# Altium footprint library MyPcbLib.PcbLib: 233 footprints (part 14 of 15)
Each footprint in its own frame and in the unit in brackets; x right, y up, seen from the top. Pads: shape width x height; smd on the part's side, far side on the other; paste and mask are expansions set on the pad; w line width, h text height; cw(c..) or ccw(c..) is an arc to the next point about the centre after c.
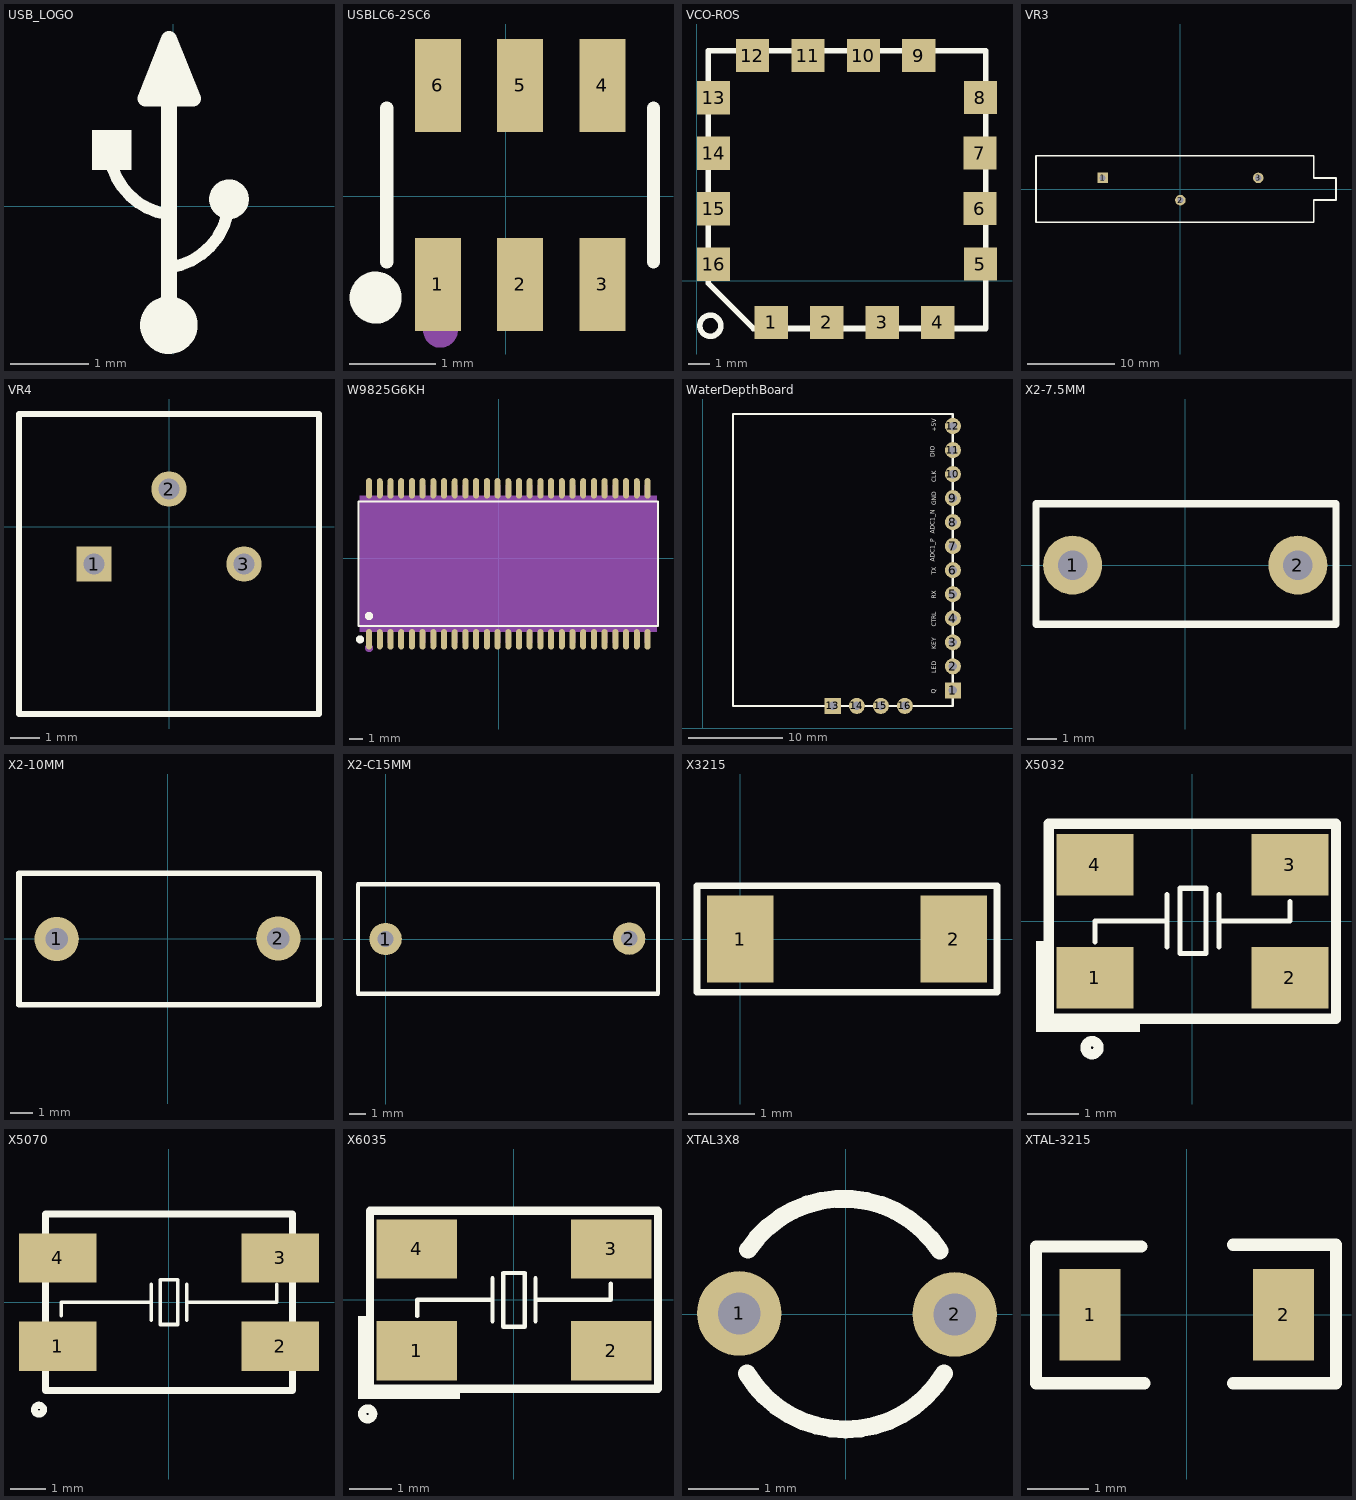
[diagram p13: the footprints below, top view; thin cyan lines are the x and y axes]

## USB_LOGO [mm]
height 10.16
Top Overlay:
  circle w0.381: c-0.053,-1.518 r0.178
  circle w0.254: c0.716,0.09 r0.127
  rectangle: -1.039,0.463 -0.529,0.973
  lines w0.152: -0.779,0.504 ccw(c0.068,0.774) -0.051,-0.107 ; -0.051,-0.784 ccw(c-0.171,0.097) 0.717,0.046
  lines w0.203: -0.051,-1.384 -0.051,2.139 ; -0.051,1.375 -0.051,2.139 ; -0.051,2.139 -0.351,1.377 0.259,1.377 -0.051,2.139
  lines w0.381: -0.051,1.479 -0.051,1.58

## USBLC6-2SC6 [mm]
pads (6):
  rect 0.532x1.072 smd: 1(-0.783,-1.02) 2(0.167,-1.02) 3(1.117,-1.02) 4(1.117,1.278) 5(0.167,1.278) 6(-0.783,1.278)
Top Overlay:
  circle w0.3: c-1.501,-1.172 r0.15
  lines w0.152: -1.372,-0.76 -1.372,1.018 ; 1.707,-0.76 1.707,1.018
Mechanical 15:
  circle w0.2: c-0.753,-1.551 r0.1

## VCO-ROS [mm] "ROS-425-319"
height 5.33
pads (16):
  rect 1.52x1.52 smd: 1(3.404,-1.905) 2(5.944,-1.905) 3(8.484,-1.905) 4(11.024,-1.905) 5(12.979,0.768) 6(12.954,3.308) 7(12.954,5.848) 8(12.979,8.388) 9(10.16,10.312) 10(7.62,10.312) 11(5.08,10.312) 12(2.54,10.312) 13(0.762,8.382) 14(0.762,5.842) 15(0.762,3.302) 16(0.762,0.762)
Top Overlay:
  circle w0.254: c0.61,-2.057 r0.483
  lines w0.254: 0.508,-0.108 2.584,-2.184 13.233,-2.184 13.233,10.541 0.508,10.541 0.508,-0.108
3D body "ROS-425-319 in CK605 case detailed.step": height 4.57, standoff 0, extent 0.508,-2.184 13.208,10.516

## VR3 [mm] "Tapped Resistor; 3 Leads"
pads (3):
  rect 1.2x1.2 hole 0.7: 1(-8.89,1.27)
  round 1.2 hole 0.7: 2(0,-1.27) 3(8.89,1.27)
Top Overlay:
  lines w0.2: -16.51,-3.81 -16.51,3.81 15.24,3.81 15.24,1.27 17.78,1.27 17.78,-1.27 15.24,-1.27 15.24,-3.81 -16.51,-3.81
3D body "vr3.STEP": height 10, standoff 0, extent -16.576,-3.556 16.424,3.544

## VR4 [mm] "Feed-Through Capacitor; 3 Leads"
pads (3):
  rect 1.2x1.2 hole 0.7: 1(-2.54,-1.27)
  round 1.2 hole 0.7: 2(0,1.27) 3(2.54,-1.27)
Top Overlay:
  lines w0.2: -5.08,-6.35 -5.08,3.81 2.54,3.81 5.08,3.81 5.08,-6.35 -5.08,-6.35
3D body "vr4.STEP": height 6, standoff 0, extent -5.022,-6.321 4.978,3.679

## W9825G6KH [mil]
pads (54):
  oval 17.64x60 smd: 1(-381.05,-238.98) 2(-349.55,-238.98) 3(-318.06,-238.98) 4(-286.56,-238.98) 5(-255.06,-238.98) 6(-223.57,-238.98) 7(-192.07,-238.98) 8(-160.57,-238.98) 9(-129.08,-238.98) 10(-97.58,-238.98) 11(-66.09,-238.98) 12(-34.59,-238.98) 13(-3.09,-238.98) 14(28.4,-238.98) 15(59.9,-238.98) 16(91.39,-238.98) 17(122.89,-238.98) 18(154.39,-238.98) 19(185.88,-238.98) 20(217.38,-238.98) 21(248.87,-238.98) 22(280.37,-238.98) 23(311.87,-238.98) 24(343.36,-238.98) 25(374.86,-238.98) 26(406.36,-238.98) 27(437.85,-238.98) 28(437.85,205.28) 29(406.36,205.28) 30(374.86,205.28) 31(343.36,205.28) 32(311.87,205.28) 33(280.37,205.28) 34(248.87,205.28) 35(217.38,205.28) 36(185.88,205.28) 37(154.39,205.28) 38(122.89,205.28) 39(91.39,205.28) 40(59.9,205.28) 41(28.4,205.28) 42(-3.09,205.28) 43(-34.59,205.28) 44(-66.09,205.28) 45(-97.58,205.28) 46(-129.08,205.28) 47(-160.57,205.28) 48(-192.07,205.28) 49(-223.57,205.28) 50(-255.06,205.28) 51(-286.56,205.28) 52(-318.06,205.28) 53(-349.55,205.28) 54(-381.05,205.28)
Top Overlay:
  circle w11.81: c-381.05,-170.35 r5.91
  circle w11.81: c-407.68,-238.98 r5.91
  lines w6: -412,-199.98 -412,166.28 468.8,166.28 468.8,-199.98 -412,-199.98
Mechanical 4:
  region: -409,-216.85 -409,183.15 465.8,183.15 465.8,-216.85
Mechanical 5:
  drawing of 108 lines, arcs and shapes, not listed
Mechanical 6:
  circle w2.36: c-409,-248.35 r1.18
Mechanical 15:
  circle w11.81: c-381.05,-264.09 r5.91

## WaterDepthBoard [mm]
pads (16):
  rect 1.7x1.7 hole 0.9: 1(26.468,3.99) 13(13.768,2.339)
  round 1.7 hole 0.9: 2(26.468,6.53) 3(26.468,9.07) 4(26.468,11.61) 5(26.468,14.15) 6(26.468,16.69) 7(26.468,19.23) 8(26.468,21.77) 9(26.468,24.31) 10(26.468,26.85) 11(26.468,29.39) 12(26.468,31.93) 14(16.308,2.339) 15(18.848,2.339) 16(21.388,2.339)
Top Overlay:
  lines w0.254: 3.227,2.339 3.227,13.642 3.227,33.2 26.468,33.2 26.468,13.642 26.468,2.339 3.227,2.339
  text "Q" at 24.816,3.625 h0.76
  text "LED" at 24.854,5.784 h0.76
  text "KEY" at 24.854,8.324 h0.76
  text "CTRL" at 24.846,10.737 h0.76
  text "RX" at 24.854,13.658 h0.76
  text "TX" at 24.854,16.198 h0.76
  text "ADC1_P" at 24.719,17.595 h0.76
  text "ADC1_N" at 24.719,20.516 h0.76
  text "GND" at 24.846,23.564 h0.76
  text "CLK" at 24.846,25.977 h0.76
  text "DIO" at 24.719,28.644 h0.76
  text "+5V" at 24.846,31.311 h0.76

## X2-7.5MM [mm]
pads (2):
  round 2 hole 1: 1(-3.823,0) 2(3.823,0)
Top Overlay:
  lines w0.254: -5.067,-2.007 5.118,-2.007 5.118,2.083 -5.067,2.083 -5.067,-2.007
3D body "10MM_X2_cap.step": height 9.5, standoff -3, extent -4.966,-1.956 5.034,2.044

## X2-10MM [mm] "18.25MM*11.4MM*5.78MM0.1UF 脚距15MM"
pads (2):
  round 2 hole 1: 1(-5,-0.013) 2(5,0.013)
Top Overlay:
  lines w0.254: -6.702,-2.984 6.836,-2.984 6.836,2.959 -6.702,2.959 -6.702,-2.984
3D body "X2-10MM.step": height 12, standoff -2.81, extent -6.5,-2.489 6.5,2.512

## X2-C15MM [mm] "18.25MM*11.4MM*5.78MM0.1UF 脚距15MM"
pads (2):
  round 2 hole 1: 1(0,0) 2(15.011,0.025)
Top Overlay:
  lines w0.254: -1.702,-3.378 16.789,-3.378 16.789,3.378 -1.702,3.378 -1.702,-3.378
3D body "X2-15MM.step": height 14, standoff -2.81, extent -1.431,-3.496 16.569,3.505

## X3215 [mm]
pads (2):
  rect 1x1.3 smd: 1(0,0) 2(3.2,0)
Top Overlay:
  lines w0.1: -0.65,-0.8 -0.65,0.8 3.85,0.8 3.85,-0.8 -0.65,-0.8
3D body "User Library-X3215.STEP": height 0.81, standoff 0, extent 0,-0.762 3.2,0.738

## X5032 [mm]
pads (4):
  rect 1.5x1.2 smd: 1(-1.9,-1.1) 2(1.9,-1.1) 3(1.9,1.1) 4(-1.9,1.1)
Top Overlay:
  circle w0.2: c-1.956,-2.464 r0.127
  rectangle: -3.023,-2.159 -1.016,-1.905
  rectangle: -3.048,-2.159 -2.87,-0.381
  lines w0.1: -1.897,-0.406 -1.897,0.008 -0.496,0.008 ; -0.496,-0.5 -0.496,0.516 ; 0.52,-0.5 0.52,0.516 ; 0.52,0.008 1.902,0.008 1.905,0.016 1.905,0.381 ; -0.242,-0.627 -0.242,0.643 0.266,0.643 0.266,0.326 0.266,-0.309 0.266,-0.627 -0.242,-0.627
  lines w0.2: -2.8,-1.9 2.8,-1.9 2.8,1.9 -2.8,1.9 -2.8,-1.9
3D body "User Library-CRYSTALSMD5X32.STEP": height 1, standoff 0, extent -2.5,-1.6 2.5,1.6

## X5070 [mm]
pads (4):
  rect 2.2x1.4 smd: 1(-3.15,-1.25) 2(3.15,-1.25) 3(3.15,1.25) 4(-3.15,1.25)
Top Overlay:
  circle w0.2: c-3.683,-3.048 r0.127
  lines w0.1: -3.048,-0.381 -3.048,0 -0.508,0 ; -0.508,-0.508 -0.508,0.508 ; 0.508,-0.508 0.508,0.508 ; 0.508,0 3.048,0 3.048,0.508 ; -0.254,-0.635 -0.254,0.635 0.254,0.635 0.254,-0.635 -0.254,-0.635
  lines w0.2: -3.5,-2.5 3.5,-2.5 3.5,2.5 -3.5,2.5 -3.5,-2.5
3D body "User Library-GeyerElectronics_KX13.STEP": height 1.31, standoff 0, extent -3.576,-2.54 3.424,2.46

## X6035 [mm]
pads (4):
  rect 1.9x1.4 smd: 1(-2.3,-1.2) 2(2.3,-1.2) 3(2.3,1.2) 4(-2.3,1.2)
Top Overlay:
  circle w0.2: c-3.454,-2.692 r0.127
  rectangle: -3.658,-2.337 -1.27,-2.108
  rectangle: -3.683,-2.337 -3.48,-0.381
  lines w0.1: -2.286,-0.381 -2.286,0 -2.032,0 -0.508,0 ; -0.508,-0.508 -0.508,0.508 ; 0.508,-0.508 0.508,0.508 ; 0.508,0 2.286,0 2.286,0.381 ; -0.254,-0.635 -0.254,0.635 0.254,0.635 0.254,-0.635 -0.254,-0.635
  lines w0.2: -3.4,-2.1 3.4,-2.1 3.4,2.1 -3.4,2.1 -3.4,-2.1
3D body "User Library-CRYSTALSMD5X32.STEP": height 1, standoff 0, extent -2.5,-1.6 2.5,1.6

## XTAL3X8 [mm]
pads (2):
  round 1.2 hole 0.6: 1(-1.509,0.013) 2(1.55,0)
Top Overlay:
  lines w0.254: -1.4,-0.841 ccw(c-0.002,-0.002) 1.398,-0.839 ; -1.386,0.917 cw(c-0.029,0.013) 1.337,0.903
3D body "User Library-Crystal TH_.STEP": height 9.28, standoff -1.5, extent -1.707,-1.586 1.743,1.614

## XTAL-3215 [mm]
height 3.5
pads (2):
  rect 1x1.5 smd: 1(-1.581,0) 2(1.581,0)
Top Overlay:
  lines w0.2: -0.743,1.118 -2.464,1.118 -2.464,-1.118 -0.692,-1.118 ; 0.756,-1.118 2.438,-1.118 2.438,1.143 0.756,1.143
3D body "XTAL3215.step": height 0.81, standoff 0, extent -1.593,-0.75 1.607,0.75